# Altium footprint library test_lib.PcbLib: 57 footprints (part 1 of 4)
Each footprint in its own frame and in the unit in brackets; x right, y up, seen from the top. Pads: shape width x height; smd on the part's side, far side on the other; paste and mask are expansions set on the pad; w line width, h text height; cw(c..) or ccw(c..) is an arc to the next point about the centre after c.
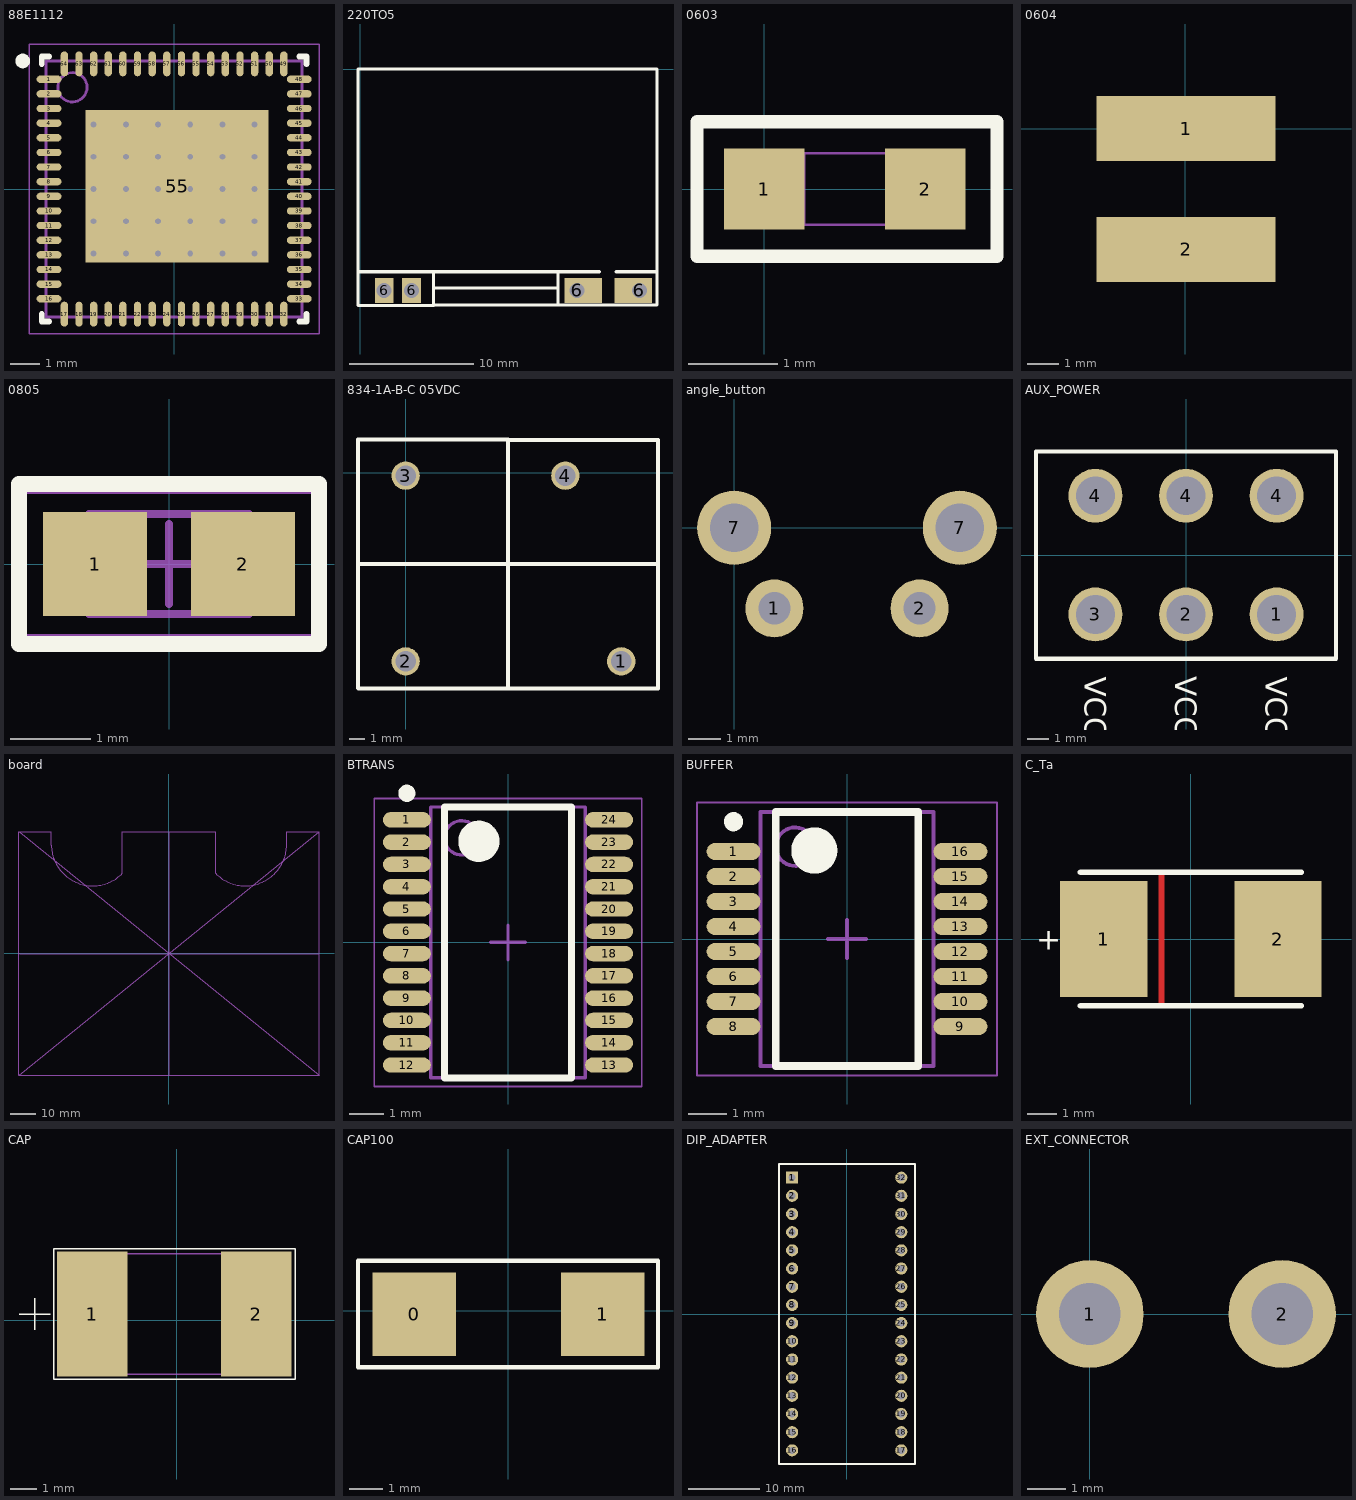
[diagram p0: the footprints below, top view; thin cyan lines are the x and y axes]

## 88E1112 [mm] "Ethernet Transceiver"
height 1
pads (65):
  oval 0.85x0.25 smd: 1(-4.275,3.75) 2(-4.275,3.25) 3(-4.275,2.75) 4(-4.275,2.25) 5(-4.275,1.75) 6(-4.275,1.25) 7(-4.275,0.75) 8(-4.275,0.25) 9(-4.275,-0.25) 10(-4.275,-0.75) 11(-4.275,-1.25) 12(-4.275,-1.75) 13(-4.275,-2.25) 14(-4.275,-2.75) 15(-4.275,-3.25) 16(-4.275,-3.75) 33(4.275,-3.75) 34(4.275,-3.25) 35(4.275,-2.75) 36(4.275,-2.25) 37(4.275,-1.75) 38(4.275,-1.25) 39(4.275,-0.75) 40(4.275,-0.25) 41(4.275,0.25) 42(4.275,0.75) 43(4.275,1.25) 44(4.275,1.75) 45(4.275,2.25) 46(4.275,2.75) 47(4.275,3.25) 48(4.275,3.75)
  oval 0.25x0.85 smd: 17(-3.75,-4.275) 18(-3.25,-4.275) 19(-2.75,-4.275) 20(-2.25,-4.275) 21(-1.75,-4.275) 22(-1.25,-4.275) 23(-0.75,-4.275) 24(-0.25,-4.275) 25(0.25,-4.275) 26(0.75,-4.275) 27(1.25,-4.275) 28(1.75,-4.275) 29(2.25,-4.275) 30(2.75,-4.275) 31(3.25,-4.275) 32(3.75,-4.275) 49(3.75,4.275) 50(3.25,4.275) 51(2.75,4.275) 52(2.25,4.275) 53(1.75,4.275) 54(1.25,4.275) 55(0.75,4.275) 56(0.25,4.275) 57(-0.25,4.275) 58(-0.75,4.275) 59(-1.25,4.275) 60(-1.75,4.275) 61(-2.25,4.275) 62(-2.75,4.275) 63(-3.25,4.275) 64(-3.75,4.275)
  rect 6.25x5.21 smd: 55(0.1,0.1)
via 2.75,-2.2 diameter 0.5 hole 0.2
via 1.65,-2.2 diameter 0.5 hole 0.2
via 0.55,-2.2 diameter 0.5 hole 0.2
via -0.55,-2.2 diameter 0.5 hole 0.2
via -1.65,-2.2 diameter 0.5 hole 0.2
via -2.75,-2.2 diameter 0.5 hole 0.2
via 2.75,-1.1 diameter 0.5 hole 0.2
via 1.65,-1.1 diameter 0.5 hole 0.2
via 0.55,-1.1 diameter 0.5 hole 0.2
via -0.55,-1.1 diameter 0.5 hole 0.2
via -1.65,-1.1 diameter 0.5 hole 0.2
via -2.75,-1.1 diameter 0.5 hole 0.2
via 2.75,0 diameter 0.5 hole 0.2
via 1.65,0 diameter 0.5 hole 0.2
via 0.55,0 diameter 0.5 hole 0.2
via -0.55,0 diameter 0.5 hole 0.2
via -1.65,0 diameter 0.5 hole 0.2
via -2.75,0 diameter 0.5 hole 0.2
via 2.75,1.1 diameter 0.5 hole 0.2
via 1.65,1.1 diameter 0.5 hole 0.2
via 0.55,1.1 diameter 0.5 hole 0.2
via -0.55,1.1 diameter 0.5 hole 0.2
via -1.65,1.1 diameter 0.5 hole 0.2
via -2.75,1.1 diameter 0.5 hole 0.2
via 2.75,2.2 diameter 0.5 hole 0.2
via 1.65,2.2 diameter 0.5 hole 0.2
via 0.55,2.2 diameter 0.5 hole 0.2
via -0.55,2.2 diameter 0.5 hole 0.2
via -1.65,2.2 diameter 0.5 hole 0.2
via -2.75,2.2 diameter 0.5 hole 0.2
Top Overlay:
  circle w0.25: c-5.175,4.375 r0.125
  lines w0.2: -4.525,-4.275 -4.525,-4.525 -4.275,-4.525 ; -4.525,4.275 -4.525,4.525 -4.275,4.525 ; 4.275,-4.525 4.525,-4.525 4.525,-4.275 ; 4.275,4.525 4.525,4.525 4.525,4.275
Mechanical 13:
  circle w0.1: c-3.475,3.475 r0.5
  lines w0.1: -4.375,-4.375 4.375,-4.375 4.375,4.375 -4.375,4.375 -4.375,-4.375
Mechanical 15:
  lines w0.05: -4.95,-4.95 4.95,-4.95 4.95,4.95 -4.95,4.95 -4.95,-4.95
  lines w0.1: -0.5,0 0.5,0 ; 0,-0.5 0,0.5
3D body: height 1, standoff 0.05, extent -4.375,-4.375 4.375,4.375

## 220TO5 [mm]
pads (4):
  rect 1.5x2 hole 1.2: 6(1.925,-17.75) 6(4.125,-17.75)
  rect 3x2 hole 1.2 copper offset 0.5,0: 6(17.4,-17.75)
  rect 3x2 hole 1.2 copper offset -0.5,0: 6(22.4,-17.75)
Top Overlay:
  lines w0.254: -0.1,-16.25 15.95,-16.25 ; 5.875,-18.9 5.875,-16.225 ; 5.888,-17.562 15.888,-17.562 ; 5.9,-18.975 -0.175,-18.975 -0.175,0.025 23.825,0.025 23.825,-18.925 15.875,-18.925 15.875,-16.25 19.2,-16.25 ; 5.9,-18.925 15.9,-18.925 ; 20.525,-16.25 23.825,-16.25

## 0603 [mm] "0603 footprint"
pads (2):
  rect 0.9x0.9 smd: 1(0,0)
  rect 0.9x0.9 smd mask+0.102: 2(1.8,0)
Top Overlay:
  lines w0.15: -0.75,-0.75 2.6,-0.75 2.6,-0.375 2.6,0.375 2.6,0.75 -0.75,0.75 -0.75,-0.75
Mechanical 1:
  lines w0.025: 0.15,0.4 0.15,-0.4 1.75,-0.4 1.75,0.4 0.16,0.4 ; 1.46,-0.4 1.46,0.4
Mechanical 2:
  lines w0.025: 0.45,-0.4 0.45,0.4

## 0604 [mm]
pads (2):
  rect 5.8x2.1 smd: 1(0.025,0) 2(0.025,-3.9)
3D body "69538.stp": height 4.8, standoff 0, extent -2.875,-4.9 2.925,0.9

## 0805 [mm]
height 0.4
pads (2):
  rect 1.3x1.3 smd: 1(-0.925,0) 2(0.925,0)
Top Overlay:
  lines w0.2: -1.875,-1 -1.875,1 1.875,1 1.875,-1 -1.875,-1
Mechanical 13:
  lines w0.1: -1,-0.625 1,-0.625 1,0.625 -1,0.625 -1,-0.625
Mechanical 15:
  lines w0.05: -1.825,-0.9 1.825,-0.9 1.825,0.9 -1.825,0.9 -1.825,-0.9
  lines w0.1: -0.5,0 0.5,0 ; 0,-0.5 0,0.5
3D body: height 0.4, standoff 0, extent -1,-0.625 1,0.625

## 834-1A-B-C 05VDC [mm] "Relay 5B 10A"
pads (4):
  round 1.8 hole 1.3: 1(13.7,-12) 2(0,-12) 3(0,-0.2) 4(10.15,-0.2)
Top Overlay:
  lines w0.254: -3.025,-13.7 -3.025,-5.8 ; -3.025,2.1 -3.025,-5.8 ; -2.988,-13.712 6.512,-13.712 15.987,-13.712 ; -2.988,2.087 6.512,2.087 ; 6.5,-13.712 6.5,2.087 ; 6.537,2.075 16.037,2.075 16.037,-5.825 16.037,-13.725 ; 15.95,-5.8 13.35,-5.8 -3.025,-5.8

## angle_button [mm] "KLS7-TS6606"
pads (4):
  round 1.8 hole 1: 1(1.25,-2.5) 2(5.75,-2.5)
  round 2.3 hole 1.5: 7(0,0) 7(7,0)

## AUX_POWER [mm] "auxiliary power port"
pads (6):
  round 2.5 hole 1.8: 1(4.2,-2.75) 2(0,-2.75) 3(-4.2,-2.75) 4(-4.2,2.75) 4(0,2.75) 4(4.2,2.75)
Top Overlay:
  lines w0.2: -6.95,-4.8 -6.95,4.8 6.95,4.8 6.95,-4.8 -6.95,-4.8
  text "VCC1" at 3.7,-5.625 h1
  text "VCC2" at -0.5,-5.625 h1
  text "VCC3-" at -4.7,-5.625 h1

## board [mm]
Mechanical 1:
  lines w0.2: -58,-47.007 58.002,-47.007 ; -45.498,41.846 -45.498,46.996 ; -17.998,30.993 -17.998,46.993 ; 0.002,-47.007 0.002,-0.007 0.002,46.993 ; 18.002,30.993 18.002,46.993 ; 45.502,41.846 45.502,46.996
  lines w0.254: -58,-47.007 -58,46.993 -45.501,46.993 ; -45.498,41.846 ccw(c-29.473,42.183) -17.998,30.993 ; -17.998,46.993 18.002,46.993 ; 18.002,30.993 ccw(c29.477,42.183) 45.502,41.846 ; 45.505,46.993 58.002,46.993 58.002,-47.007
  lines w0.45: -57.998,-47.007 58.002,46.993 ; -57.998,46.993 58.002,-47.007 ; -57.716,-0.007 0.002,-0.007 58.002,-0.007

## BTRANS [mm]
height 1.2
pads (24):
  oval 1.4x0.45 smd: 1(-2.95,3.575) 2(-2.95,2.925) 3(-2.95,2.275) 4(-2.95,1.625) 5(-2.95,0.975) 6(-2.95,0.325) 7(-2.95,-0.325) 8(-2.95,-0.975) 9(-2.95,-1.625) 10(-2.95,-2.275) 11(-2.95,-2.925) 12(-2.95,-3.575) 13(2.95,-3.575) 14(2.95,-2.925) 15(2.95,-2.275) 16(2.95,-1.625) 17(2.95,-0.975) 18(2.95,-0.325) 19(2.95,0.325) 20(2.95,0.975) 21(2.95,1.625) 22(2.95,2.275) 23(2.95,2.925) 24(2.95,3.575)
Top Overlay:
  circle w0.25: c-2.95,4.35 r0.125
  circle w0.6: c-0.85,2.95 r0.3
  lines w0.2: -1.85,-3.95 -1.85,3.95 1.85,3.95 1.85,-3.95 -1.85,-3.95
Mechanical 13:
  circle w0.1: c-1.35,3.05 r0.5
  lines w0.1: -2.25,-3.95 -2.25,3.95 2.25,3.95 2.25,-3.95 -2.25,-3.95
Mechanical 15:
  lines w0.05: -3.9,-4.2 -3.9,4.2 3.9,4.2 3.9,-4.2 -3.9,-4.2
  lines w0.1: -0.5,0 0.5,0 ; 0,-0.5 0,0.5
3D body: height 1.2, standoff 0.05, extent -2.25,-3.95 2.25,3.95

## BUFFER [mm] "txs0108epwr voltage translator"
height 1.2
pads (16):
  oval 1.4x0.45 smd: 1(-2.95,2.275) 2(-2.95,1.625) 3(-2.95,0.975) 4(-2.95,0.325) 5(-2.95,-0.325) 6(-2.95,-0.975) 7(-2.95,-1.625) 8(-2.95,-2.275) 9(2.95,-2.275) 10(2.95,-1.625) 11(2.95,-0.975) 12(2.95,-0.325) 13(2.95,0.325) 14(2.95,0.975) 15(2.95,1.625) 16(2.95,2.275)
Top Overlay:
  circle w0.25: c-2.95,3.05 r0.125
  circle w0.6: c-0.85,2.3 r0.3
  lines w0.2: -1.85,-3.3 -1.85,3.3 1.85,3.3 1.85,-3.3 -1.85,-3.3
Mechanical 13:
  circle w0.1: c-1.35,2.4 r0.5
  lines w0.1: -2.25,-3.3 -2.25,3.3 2.25,3.3 2.25,-3.3 -2.25,-3.3
Mechanical 15:
  lines w0.05: -3.9,-3.55 -3.9,3.55 3.9,3.55 3.9,-3.55 -3.9,-3.55
  lines w0.1: -0.5,0 0.5,0 ; 0,-0.5 0,0.5
3D body: height 1.2, standoff 0.15, extent -2.25,-3.3 2.25,3.3

## C_Ta [mm]
pads (2):
  rect 3x4 smd: 1(-3,0) 2(3,0)
Top Layer:
  lines w0.2: -1.016,-2.159 -1.016,2.159
Top Overlay:
  lines w0.2: -3.8,-2.3 3.8,-2.3 ; -3.8,2.3 3.8,2.3
  text "+" at -5.334,-0.375 h0.75
3D body "CAPMP7343X430N.stp": height 4.3, standoff 0, extent -3.8,-2.3 3.8,2.3

## CAP [mm]
pads (2):
  rect 2.7x4.8 smd: 1(-3.238,0.24) 2(3.062,0.24)
Top Overlay:
  lines w0.05: -6.038,0.24 -4.838,0.24 ; -5.438,-0.36 -5.438,0.84 ; -4.698,-2.26 4.552,-2.26 4.552,2.74 -4.698,2.74 -4.698,-2.26
Mechanical 1:
  lines w0.05: -3.788,-2.06 3.612,-2.06 3.612,2.54 -3.788,2.54 -3.788,-2.06

## CAP100 [mm]
pads (2):
  rect 2.5x2.5 smd: 0(-2.812,-0.111) 1(2.838,-0.111)
Top Layer:
  lines w0.5: 2.236,-0.111 2.838,-0.111 2.838,-0.913
Top Overlay:
  lines w0.125: -4.5,-1.7 -4.5,1.5 4.5,1.5 4.5,-1.7 -4.5,-1.7

## DIP_ADAPTER [mm]
pads (32):
  rect 1.7x1.7 hole 1: 1(-7.625,19.1)
  round 1.7 hole 1: 2(-7.625,16.56) 3(-7.625,14.02) 4(-7.625,11.48) 5(-7.625,8.94) 6(-7.625,6.4) 7(-7.625,3.86) 8(-7.625,1.32) 9(-7.625,-1.22) 10(-7.625,-3.76) 11(-7.625,-6.3) 12(-7.625,-8.84) 13(-7.625,-11.38) 14(-7.625,-13.92) 15(-7.625,-16.46) 16(-7.625,-19) 17(7.625,-19) 18(7.625,-16.46) 19(7.625,-13.92) 20(7.625,-11.38) 21(7.625,-8.84) 22(7.625,-6.3) 23(7.625,-3.76) 24(7.625,-1.22) 25(7.625,1.32) 26(7.625,3.86) 27(7.625,6.4) 28(7.625,8.94) 29(7.625,11.48) 30(7.625,14.02) 31(7.625,16.56) 32(7.625,19.1)
Top Overlay:
  lines w0.254: -9.45,-20.905 9.53,-20.905 9.53,21.005 -9.45,21.005 -9.45,-20.905

## EXT_CONNECTOR [mm] "KLS2-129-5.00-02P-4S"
pads (2):
  round 2.8 hole 1.6: 1(0,0) 2(5,0)
3D body "User Library-KLS2-340-3_81-1.step": height 8.4, standoff -3.27, extent -1.78,-3.35 6.84,3.65